# Altium footprint library PCB贴片元件封装库.pcblib: 366 footprints (part 2 of 23)
Each footprint in its own frame and in the unit in brackets; x right, y up, seen from the top. Pads: shape width x height; smd on the part's side, far side on the other; paste and mask are expansions set on the pad; w line width, h text height; cw(c..) or ccw(c..) is an arc to the next point about the centre after c.
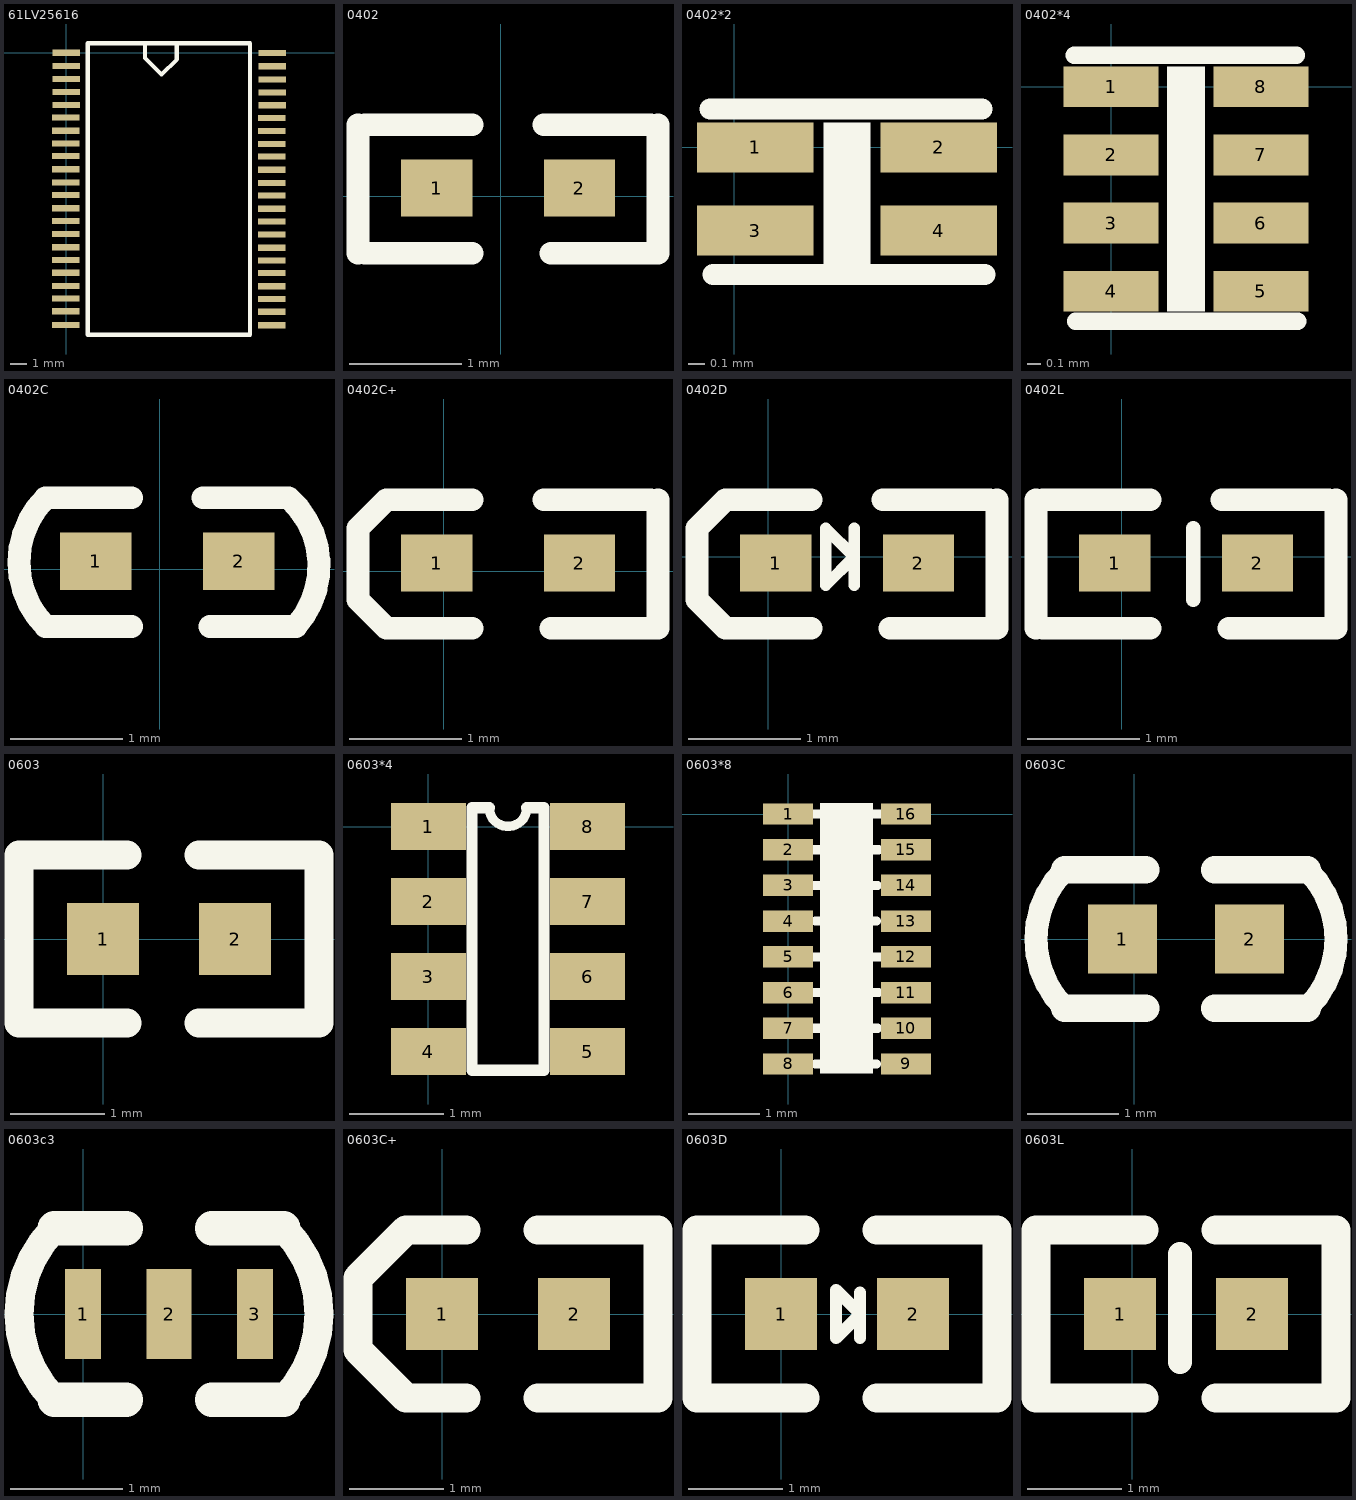
[diagram p1: the footprints below, top view; thin cyan lines are the x and y axes]

## 61LV25616 [mil]
pads (44):
  rect 66.93x15 smd: 1(0,0) 2(0,-32) 3(0,-64) 4(0,-96) 5(0,-127) 6(-1,-158) 7(-1,-190) 8(-1,-221) 9(-1,-252) 10(-1,-284) 11(-1,-316) 12(-1,-347) 13(-1,-379) 14(-1,-410) 15(-1,-442) 16(-1,-474) 17(-1,-505) 18(-1,-536) 19(-1,-568) 20(-1,-599) 21(-1,-630) 22(-1,-663) 23(500,-664) 24(500,-631) 25(500,-600) 26(500,-569) 27(500,-537) 28(500,-506) 29(500,-475) 30(500,-443) 31(500,-411) 32(500,-380) 33(500,-348) 34(500,-317) 35(500,-285) 36(500,-253) 37(500,-222) 38(500,-191) 39(500,-159) 40(501,-128) 41(501,-97) 42(501,-65) 43(501,-33) 44(501,-1)
TopOverlay:
  lines w10: 192,23 192,-13 232,-53 269,-16 269,20 272,23 ; 52,-687 52,23 447,23 447,-687 52,-687

## 0402 [mil]
pads (2):
  rect 25x20 smd: 1(-22.48,2.83) 2(27.52,2.83)
TopOverlay:
  lines w8: -50,-20 -50,25 ; -47.52,-20 -10,-20 ; -47.52,25 -10,25 ; 15,25 52.48,25 ; 17.52,-20 55,-20 55,25

## 0402*2 [mm]
pads (4):
  rect 0.7x0.3 smd: 1(0.127,0) 2(1.227,0) 3(0.127,-0.5) 4(1.227,-0.5)
TopOverlay:
  rectangle: 0.537,-0.762 0.817,0.15
  lines w0.127: -0.143,0.23 1.487,0.23 ; -0.127,-0.762 1.503,-0.762

## 0402*4 [mm]
pads (8):
  rect 0.7x0.3 smd: 1(0,0) 2(0,-0.5) 3(0,-1) 4(0,-1.5) 5(1.1,-1.5) 6(1.1,-1) 7(1.1,-0.5) 8(1.1,0)
TopOverlay:
  rectangle: 0.41,-1.65 0.69,0.15
  lines w0.127: -0.27,0.23 1.36,0.23 ; -0.26,-1.72 1.37,-1.72

## 0402C [mil]
pads (2):
  rect 25x20 smd: 1(-22.48,2.83) 2(27.52,2.83)
TopOverlay:
  lines w8: -10,-20 -40,-20 cw(c-17.5,2.5) -40,25 -10,25 ; 15,25 45,25 cw(c23.76,1.24) 47.52,-20 17.52,-20

## 0402C+ [mil]
pads (2):
  rect 25x20 smd: 1(-2.48,2.83) 2(47.52,2.83)
TopOverlay:
  lines w8: 10,-20 -20,-20 -30,-10 -30,15 -20,25 10,25 ; 35,25 72.48,25 ; 37.52,-20 75,-20 75,25

## 0402D [mil]
pads (2):
  rect 25x20 smd: 1(2.52,-2.17) 2(52.52,-2.17)
TopOverlay:
  lines w4: 30,-10 30,10 ; 20,-10 20,10 30,0 20,-10
  lines w8: 15,-25 -15,-25 -25,-15 -25,10 -15,20 15,20 ; 40,20 77.48,20 ; 42.52,-25 80,-25 80,20

## 0402L [mil]
pads (2):
  rect 25x20 smd: 1(-2.48,-2.17) 2(47.52,-2.17)
TopOverlay:
  lines w5: 25,-15 25,10
  lines w8: -30,-25 -30,20 ; -27.52,-25 10,-25 ; -27.52,20 10,20 ; 35,20 72.48,20 ; 37.52,-25 75,-25 75,20

## 0603 [mil]
pads (2):
  rect 30x30 smd: 1(0,0) 2(55,0)
TopOverlay:
  lines w12: 10,-35 -35,-35 -35,35 10,35 ; 40,-35 90,-35 90,35 40,35

## 0603*4 [mm]
pads (8):
  rect 0.8x0.5 smd: 1(0,0) 2(0,-0.8) 3(0,-1.6) 4(0,-2.4) 5(1.7,-2.4) 6(1.7,-1.6) 7(1.7,-0.8) 8(1.7,0)
TopOverlay:
  lines w0.1: 0.65,0.2 ccw(c0.85,0.2) 1.05,0.2
  lines w0.12: 0.65,0.2 0.465,0.2 0.465,-2.6 1.235,-2.6 1.235,0.2 1.05,0.2

## 0603*8 [mm]
pads (16):
  rect 0.7x0.3 smd: 1(0,0) 2(0,-0.5) 3(0,-1) 4(0,-1.5) 5(0,-2) 6(0,-2.5) 7(0,-3) 8(0,-3.5) 9(1.65,-3.5) 10(1.65,-3) 11(1.65,-2.5) 12(1.65,-2) 13(1.65,-1.5) 14(1.65,-1) 15(1.65,-0.5) 16(1.65,0)
TopOverlay:
  rectangle: 0.45,-3.632 1.19,0.157
  lines w0.127: 0.37,-3 1.25,-3 ; 0.37,-2.5 1.27,-2.5 ; 0.37,-2 1.28,-2 ; 0.37,-1 1.25,-1 ; 0.37,-0.5 1.27,-0.5 ; 0.37,0 1.28,0 ; 0.38,-3.5 1.24,-3.5 ; 0.38,-1.5 1.24,-1.5

## 0603C [mil]
pads (2):
  rect 30x30 smd: 1(-5,0) 2(50,0)
TopOverlay:
  lines w10: -30,-30 cw(c0,0) -30,30 ; 75,-30 ccw(c45,0) 75,30
  lines w12: -30,-30 5,-30 ; -30,30 5,30 ; 35,-30 75,-30 ; 35,30 75,30

## 0603c3 [mm]
pads (3):
  rect 0.32x0.8 smd: 1(0,0) 3(1.524,0)
  rect 0.4x0.8 smd: 2(0.762,0)
TopOverlay:
  lines w0.254: -0.254,-0.762 cw(c0.508,0) -0.254,0.762 ; 1.778,-0.762 ccw(c1.016,0) 1.778,0.762
  lines w0.305: -0.254,-0.762 0.381,-0.762 ; -0.254,0.762 0.381,0.762 ; 1.143,-0.762 1.778,-0.762 ; 1.143,0.762 1.778,0.762

## 0603C+ [mil]
pads (2):
  rect 30x30 smd: 1(0,0) 2(55,0)
TopOverlay:
  lines w12: 10,-35 -15,-35 -35,-15 -35,15 -15,35 10,35 ; 40,-35 90,-35 90,35 40,35

## 0603D [mil]
pads (2):
  rect 30x30 smd: 1(0,0) 2(55,0)
TopOverlay:
  lines w5: 23,0 23,9 23,-10 33,0 23,10 ; 33,-10 33,9
  lines w12: 10,-35 -35,-35 -35,35 10,35 ; 40,-35 90,-35 90,35 40,35

## 0603L [mil]
pads (2):
  rect 30x30 smd: 1(-5,0) 2(50,0)
TopOverlay:
  lines w10: 20,-20 20,25
  lines w12: 5,-35 -40,-35 -40,35 5,35 ; 35,-35 85,-35 85,35 35,35